# Altium schematic symbol library FPGA_Xilinx_Virtex7.SchLib: 34 symbols (part 26 of 34)
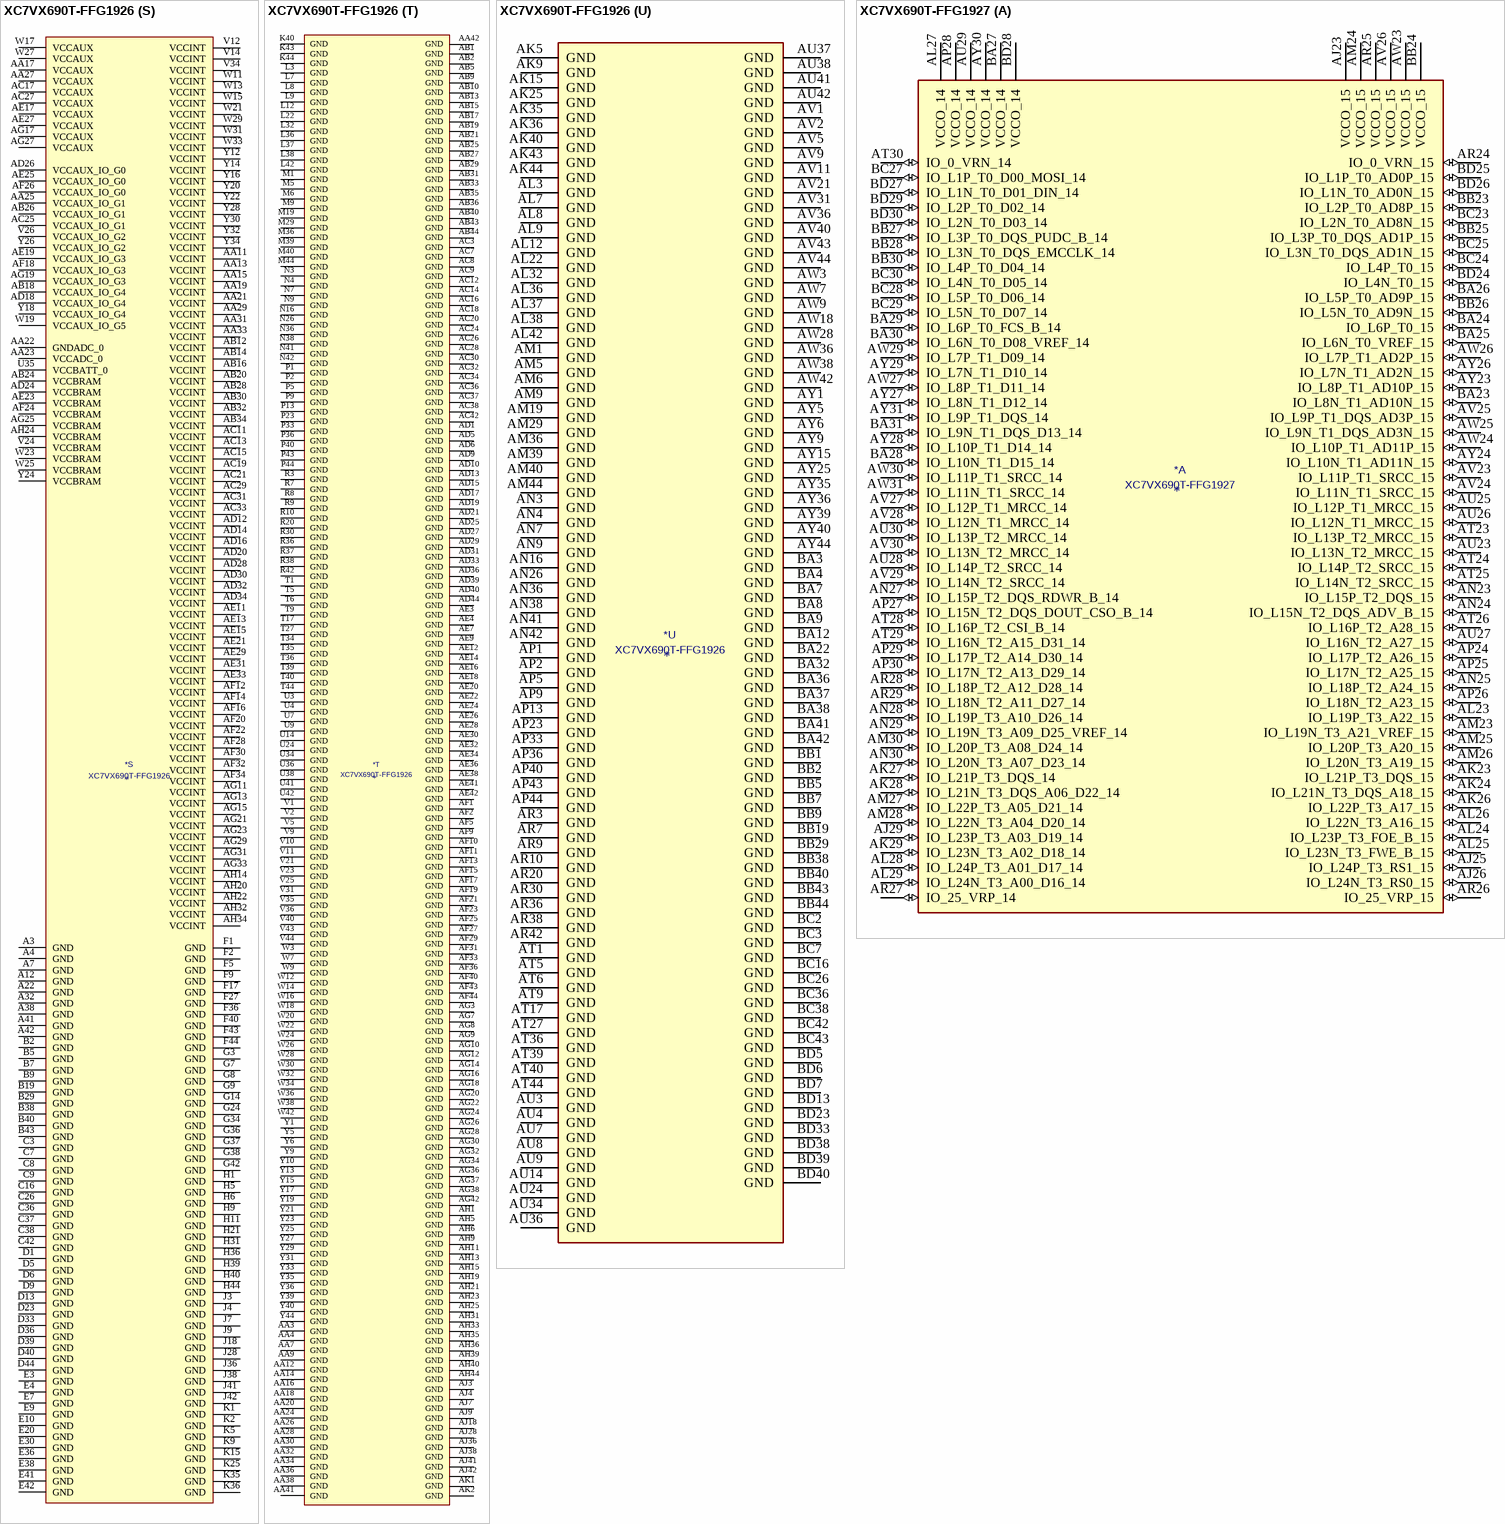
[diagram p197: symbols XC7VX690T-FFG1926 to XC7VX690T-FFG1927]

## XC7VX690T-FFG1926
designator *  value XC7VX690T-FFG1926
ki_keywords: FPGA; ki_description: Virtex 7 XT 690 XC7VX690T-FFG1926
part A pins: AH26 VCCO_11 (power), AH27 IO_L1P_T0_11 (io), AH28 IO_L1N_T0_11 (io), AH29 IO_L3P_T0_DQS_11 (io), AH30 IO_0_VRN_10 (io), AJ26 IO_L2P_T0_11 (io), AJ27 IO_L2N_T0_11 (io), AJ29 IO_L3N_T0_DQS_11 (io), AJ30 IO_L2P_T0_10 (io), AJ31 IO_L2N_T0_10 (io), AK26 IO_L6P_T0_11 (io), AK27 IO_L4P_T0_11 (io), AK28 IO_L4N_T0_11 (io), AK29 IO_L5P_T0_11 (io), AK30 VCCO_10 (power), AK31 IO_L1P_T0_10 (io), AL25 IO_0_VRN_11 (io), AL26 IO_L6N_T0_VREF_11 (io), AL27 VCCO_11 (power), AL28 IO_25_VRP_11 (io), AL29 IO_L5N_T0_11 (io), AL30 IO_L4P_T0_10 (io), AL31 IO_L1N_T0_10 (io), AM25 IO_L8P_T1_11 (io), AM26 IO_L8N_T1_11 (io), AM27 IO_L7P_T1_11 (io), AM28 IO_L7N_T1_11 (io), AM30 IO_L3P_T0_DQS_10 (io), AM31 IO_L4N_T0_10 (io), AM32 IO_L5P_T0_10 (io), AN25 IO_L10P_T1_11 (io), AN27 IO_L9P_T1_DQS_11 (io), AN28 IO_L9N_T1_DQS_11 (io), AN29 IO_L6P_T0_10 (io), AN30 IO_L3N_T0_DQS_10 (io), AN31 VCCO_10 (power), AN32 IO_L5N_T0_10 (io), AP25 IO_L10N_T1_11 (io), AP26 IO_L12P_T1_MRCC_11 (io), AP27 IO_L12N_T1_MRCC_11 (io), AP28 VCCO_11 (power), AP29 IO_25_VRP_10 (io), AP30 IO_L6N_T0_VREF_10 (io), AP31 IO_L15P_T2_DQS_10 (io), AR25 VCCO_11 (power), AR26 IO_L13P_T2_MRCC_11 (io), AR27 IO_L11P_T1_SRCC_11 (io), AR28 IO_L11N_T1_SRCC_11 (io), AR29 IO_L16P_T2_10 (io), AR31 IO_L15N_T2_DQS_10 (io), AT25 IO_L14P_T2_SRCC_11 (io), AT26 IO_L13N_T2_MRCC_11 (io), AT28 IO_L18P_T2_10 (io), AT29 IO_L18N_T2_10 (io), AT30 IO_L16N_T2_10 (io), AT31 IO_L17P_T2_10 (io), AU25 IO_L15P_T2_DQS_11 (io), AU26 IO_L14N_T2_SRCC_11 (io), AU27 IO_L18P_T2_11 (io), AU28 IO_L14P_T2_SRCC_10 (io), AU29 VCCO_10 (power), AU30 IO_L13P_T2_MRCC_10 (io), AU31 IO_L17N_T2_10 (io), AV25 IO_L15N_T2_DQS_11 (io), AV26 VCCO_11 (power), AV27 IO_L18N_T2_11 (io), AV28 IO_L14N_T2_SRCC_10 (io), AV29 IO_L11P_T1_SRCC_10 (io), AV30 IO_L13N_T2_MRCC_10 (io), AW25 IO_L17P_T2_11 (io), AW26 IO_L17N_T2_11 (io), AW27 IO_L16P_T2_11 (io), AW29 IO_L11N_T1_SRCC_10 (io), AW30 IO_L12P_T1_MRCC_10 (io), AW31 IO_L12N_T1_MRCC_10 (io), AY26 IO_L19P_T3_11 (io), AY27 IO_L16N_T2_11 (io), AY28 IO_L7P_T1_10 (io), AY29 IO_L9P_T1_DQS_10 (io), AY30 VCCO_10 (power), AY31 IO_L10P_T1_10 (io), AY32 IO_L10N_T1_10 (io), BA25 IO_L22P_T3_11 (io), BA26 IO_L19N_T3_VREF_11 (io), BA27 VCCO_11 (power), BA28 IO_L7N_T1_10 (io), BA29 IO_L9N_T1_DQS_10 (io), BA30 IO_L8P_T1_10 (io), BA31 IO_L8N_T1_10 (io), BB24 VCCO_11 (power), BB25 IO_L22N_T3_11 (io), BB26 IO_L23P_T3_11 (io), BB27 IO_L23N_T3_11 (io), BB28 IO_L20P_T3_10 (io), BB30 IO_L19P_T3_10 (io), BB31 IO_L19N_T3_VREF_10 (io), BB32 IO_L23P_T3_10 (io), BC25 IO_L21P_T3_DQS_11 (io), BC27 IO_L24P_T3_11 (io), BC28 IO_L20N_T3_10 (io), BC29 IO_L22P_T3_10 (io), BC30 IO_L24P_T3_10 (io), BC31 VCCO_10 (power), BC32 IO_L23N_T3_10 (io), BD24 IO_L20P_T3_11 (io), BD25 IO_L20N_T3_11 (io), BD26 IO_L21N_T3_DQS_11 (io), BD27 IO_L24N_T3_11 (io), BD28 VCCO_10 (power), BD29 IO_L22N_T3_10 (io), BD30 IO_L24N_T3_10 (io), BD31 IO_L21P_T3_DQS_10 (io), BD32 IO_L21N_T3_DQS_10 (io)
part B pins: A23 IO_L24P_T3_13 (io), A24 IO_L24N_T3_13 (io), A25 IO_L22P_T3_13 (io), A26 IO_L22N_T3_13 (io), AJ21 IO_0_VRN_12 (io), AJ22 IO_L4P_T0_12 (io), AJ23 VCCO_12 (power), AJ24 IO_L1N_T0_12 (io), AJ25 IO_L1P_T0_12 (io), AK21 IO_L2P_T0_12 (io), AK22 IO_L4N_T0_12 (io), AK23 IO_L3N_T0_DQS_12 (io), AK24 IO_L3P_T0_DQS_12 (io), AL21 IO_L2N_T0_12 (io), AL23 IO_L5P_T0_12 (io), AL24 IO_25_VRP_12 (io), AM21 IO_L6N_T0_VREF_12 (io), AM22 IO_L6P_T0_12 (io), AM23 IO_L5N_T0_12 (io), AM24 VCCO_12 (power), AN21 VCCO_12 (power), AN22 IO_L10N_T1_12 (io), AN23 IO_L10P_T1_12 (io), AN24 IO_L7P_T1_12 (io), AP21 IO_L8N_T1_12 (io), AP22 IO_L8P_T1_12 (io), AP24 IO_L7N_T1_12 (io), AR21 IO_L12N_T1_MRCC_12 (io), AR22 IO_L12P_T1_MRCC_12 (io), AR23 IO_L9N_T1_DQS_12 (io), AR24 IO_L9P_T1_DQS_12 (io), AT21 IO_L13P_T2_MRCC_12 (io), AT22 VCCO_12 (power), AT23 IO_L11N_T1_SRCC_12 (io), AT24 IO_L11P_T1_SRCC_12 (io), AU21 IO_L13N_T2_MRCC_12 (io), AU22 IO_L14N_T2_SRCC_12 (io), AU23 IO_L14P_T2_SRCC_12 (io), AV22 IO_L16N_T2_12 (io), AV23 IO_L16P_T2_12 (io), AV24 IO_L18P_T2_12 (io), AW21 IO_L15N_T2_DQS_12 (io), AW22 IO_L15P_T2_DQS_12 (io), AW23 VCCO_12 (power), AW24 IO_L18N_T2_12 (io), AY21 IO_L17N_T2_12 (io), AY22 IO_L17P_T2_12 (io), AY23 IO_L19N_T3_VREF_12 (io), AY24 IO_L19P_T3_12 (io), B24 VCCO_13 (power), B25 IO_L20P_T3_13 (io), B26 IO_L20N_T3_13 (io), BA21 IO_L20P_T3_12 (io), BA23 IO_L21N_T3_DQS_12 (io), BA24 IO_L21P_T3_DQS_12 (io), BB21 IO_L20N_T3_12 (io), BB22 IO_L23N_T3_12 (io), BB23 IO_L23P_T3_12 (io), BC21 VCCO_12 (power), BC22 IO_L22P_T3_12 (io), BC23 IO_L24N_T3_12 (io), BC24 IO_L24P_T3_12 (io), BD22 IO_L22N_T3_12 (io), C24 IO_L23P_T3_13 (io), C25 IO_L23N_T3_13 (io), D24 IO_L21P_T3_DQS_13 (io), D25 IO_L21N_T3_DQS_13 (io), D26 IO_L19N_T3_VREF_13 (io), E24 IO_L18N_T2_13 (io), E25 VCCO_13 (power), E26 IO_L19P_T3_13 (io), F24 IO_L18P_T2_13 (io), F25 IO_L16P_T2_13 (io), F26 IO_L16N_T2_13 (io), G25 IO_L17P_T2_13 (io), G26 IO_L17N_T2_13 (io), H24 IO_L15P_T2_DQS_13 (io), H25 IO_L15N_T2_DQS_13 (io), H26 VCCO_13 (power), H27 IO_L13N_T2_MRCC_13 (io), J24 IO_L14P_T2_SRCC_13 (io), J25 IO_L14N_T2_SRCC_13 (io), J26 IO_L11N_T1_SRCC_13 (io), J27 IO_L13P_T2_MRCC_13 (io), K24 IO_L9N_T1_DQS_13 (io), K26 IO_L11P_T1_SRCC_13 (io), K27 IO_L12N_T1_MRCC_13 (io), L24 IO_L9P_T1_DQS_13 (io), L25 IO_L7N_T1_13 (io), L26 IO_L12P_T1_MRCC_13 (io), L27 VCCO_13 (power), M24 VCCO_13 (power), M25 IO_L7P_T1_13 (io), M26 IO_L10P_T1_13 (io), M27 IO_L10N_T1_13 (io), N24 IO_L8P_T1_13 (io), N25 IO_L8N_T1_13 (io), N27 IO_0_VRN_13 (io), P24 IO_L5P_T0_13 (io), P25 IO_L5N_T0_13 (io), P26 IO_L3P_T0_DQS_13 (io), P27 IO_L3N_T0_DQS_13 (io), R24 IO_L6N_T0_VREF_13 (io), R25 VCCO_13 (power), R26 IO_L1P_T0_13 (io), R27 IO_L1N_T0_13 (io), T24 IO_L6P_T0_13 (io), T25 IO_L4P_T0_13 (io), T26 IO_L4N_T0_13 (io), U25 IO_25_VRP_13 (io), U26 IO_L2P_T0_13 (io), U27 IO_L2N_T0_13 (io)
part C pins: A31 IO_L1N_T0_AD0N_15 (io), AJ32 IO_L4P_T0_D04_14 (io), AJ33 VCCO_14 (power), AJ34 IO_L2P_T0_D02_14 (io), AJ35 IO_0_VRN_14 (io), AK32 IO_L4N_T0_D05_14 (io), AK33 IO_L6P_T0_FCS_B_14 (io), AK34 IO_L2N_T0_D03_14 (io), AL33 IO_L3P_T0_DQS_PUDC_B_14 (io), AL34 IO_L6N_T0_D08_VREF_14 (io), AL35 IO_L5P_T0_D06_14 (io), AM33 IO_L3N_T0_DQS_EMCCLK_14 (io), AM34 VCCO_14 (power), AM35 IO_L5N_T0_D07_14 (io), AN33 IO_25_VRP_14 (io), AN34 IO_L1P_T0_D00_MOSI_14 (io), AN35 IO_L1N_T0_D01_DIN_14 (io), AP32 IO_L7P_T1_D09_14 (io), AP34 IO_L8P_T1_D11_14 (io), AP35 IO_L8N_T1_D12_14 (io), AR32 IO_L7N_T1_D10_14 (io), AR33 IO_L10P_T1_D14_14 (io), AR34 IO_L10N_T1_D15_14 (io), AR35 VCCO_14 (power), AT32 VCCO_14 (power), AT33 IO_L9P_T1_DQS_14 (io), AT34 IO_L9N_T1_DQS_D13_14 (io), AT35 IO_L12P_T1_MRCC_14 (io), AU32 IO_L11P_T1_SRCC_14 (io), AU33 IO_L11N_T1_SRCC_14 (io), AU35 IO_L12N_T1_MRCC_14 (io), AV32 IO_L14P_T2_SRCC_14 (io), AV33 IO_L13P_T2_MRCC_14 (io), AV34 IO_L13N_T2_MRCC_14 (io), AV35 IO_L15P_T2_DQS_RDWR_B_14 (io), AW32 IO_L14N_T2_SRCC_14 (io), AW33 VCCO_14 (power), AW34 IO_L17P_T2_A14_D30_14 (io), AW35 IO_L15N_T2_DQS_DOUT_CSO_B_14 (io), AY33 IO_L16P_T2_CSI_B_14 (io), AY34 IO_L17N_T2_A13_D29_14 (io), B31 IO_L1P_T0_AD0P_15 (io), B32 IO_L3N_T0_DQS_AD1N_15 (io), BA33 IO_L16N_T2_A15_D31_14 (io), BA34 IO_L18P_T2_A12_D28_14 (io), BA35 IO_L18N_T2_A11_D27_14 (io), BB33 IO_L20P_T3_A08_D24_14 (io), BB34 VCCO_14 (power), BB35 IO_L19P_T3_A10_D26_14 (io), BB36 IO_L19N_T3_A09_D25_VREF_14 (io), BB37 IO_L21P_T3_DQS_14 (io), BC33 IO_L20N_T3_A07_D23_14 (io), BC34 IO_L22P_T3_A05_D21_14 (io), BC35 IO_L22N_T3_A04_D20_14 (io), BC37 IO_L21N_T3_DQS_A06_D22_14 (io), BD34 IO_L24P_T3_A01_D17_14 (io), BD35 IO_L24N_T3_A00_D16_14 (io), BD36 IO_L23P_T3_A03_D19_14 (io), BD37 IO_L23N_T3_A02_D18_14 (io), C31 VCCO_15 (power), C32 IO_L3P_T0_DQS_AD1P_15 (io), D31 IO_L5N_T0_AD9N_15 (io), D32 IO_L4N_T0_15 (io), E31 IO_L5P_T0_AD9P_15 (io), E32 IO_L4P_T0_15 (io), F31 IO_L2N_T0_AD8N_15 (io), F32 VCCO_15 (power), G31 IO_L2P_T0_AD8P_15 (io), G32 IO_L6P_T0_15 (io), G33 IO_L6N_T0_VREF_15 (io), H32 IO_L9N_T1_DQS_AD3N_15 (io), H33 IO_L8P_T1_AD10P_15 (io), H34 IO_L8N_T1_AD10N_15 (io), J31 IO_L7N_T1_AD2N_15 (io), J32 IO_L9P_T1_DQS_AD3P_15 (io), J33 VCCO_15 (power), J34 IO_L10P_T1_AD11P_15 (io), J35 IO_L10N_T1_AD11N_15 (io), K31 IO_L7P_T1_AD2P_15 (io), K32 IO_L11N_T1_SRCC_15 (io), K33 IO_L12P_T1_MRCC_15 (io), K34 IO_L12N_T1_MRCC_15 (io), L31 IO_L11P_T1_SRCC_15 (io), L33 IO_L13P_T2_MRCC_15 (io), L34 IO_L13N_T2_MRCC_15 (io), L35 IO_L16N_T2_A27_15 (io), M31 IO_L14P_T2_SRCC_15 (io), M32 IO_L14N_T2_SRCC_15 (io), M33 IO_L18N_T2_A23_15 (io), M34 VCCO_15 (power), M35 IO_L16P_T2_A28_15 (io), N31 VCCO_15 (power), N32 IO_L17N_T2_A25_15 (io), N33 IO_L18P_T2_A24_15 (io), N34 IO_L15P_T2_DQS_15 (io), N35 IO_L15N_T2_DQS_ADV_B_15 (io), P31 IO_L20N_T3_A19_15 (io), P32 IO_L17P_T2_A26_15 (io), P34 IO_L24N_T3_RS0_15 (io), P35 IO_0_VRN_15 (io), R31 IO_L20P_T3_A20_15 (io), R32 IO_L22P_T3_A17_15 (io), R33 IO_L22N_T3_A16_15 (io), R34 IO_L24P_T3_RS1_15 (io), R35 VCCO_15 (power), T31 IO_L19N_T3_A21_VREF_15 (io), T32 VCCO_15 (power), T33 IO_L21N_T3_DQS_A18_15 (io), U31 IO_L19P_T3_A22_15 (io), U32 IO_L21P_T3_DQS_15 (io), U33 IO_L23N_T3_FWE_B_15 (io), V32 IO_25_VRP_15 (io), V33 IO_L23P_T3_FOE_B_15 (io)
part D pins: A27 VCCO_16 (power), A28 IO_L24P_T3_16 (io), A29 IO_L24N_T3_16 (io), A30 IO_L23N_T3_16 (io), A33 IO_L16P_T2_17 (io), A34 IO_L16N_T2_17 (io), A35 IO_L15P_T2_DQS_17 (io), A36 IO_L15N_T2_DQS_17 (io), A37 VCCO_17 (power), B27 IO_L22P_T3_16 (io), B28 IO_L22N_T3_16 (io), B30 IO_L23P_T3_16 (io), B33 IO_L6N_T0_VREF_17 (io), B34 VCCO_17 (power), B35 IO_L18P_T2_17 (io), B36 IO_L17P_T2_17 (io), B37 IO_L17N_T2_17 (io), C27 IO_L20P_T3_16 (io), C28 IO_L20N_T3_16 (io), C29 IO_L21P_T3_DQS_16 (io), C30 IO_L21N_T3_DQS_16 (io), C33 IO_L12P_T1_MRCC_17 (io), C34 IO_L12N_T1_MRCC_17 (io), C35 IO_L11N_T1_SRCC_17 (io), D27 IO_L18N_T2_16 (io), D28 VCCO_16 (power), D29 IO_L19P_T3_16 (io), D30 IO_L19N_T3_VREF_16 (io), D34 IO_L13N_T2_MRCC_17 (io), D35 IO_L11P_T1_SRCC_17 (io), E27 IO_L18P_T2_16 (io), E28 IO_L16P_T2_16 (io), E29 IO_L16N_T2_16 (io), E33 IO_L13P_T2_MRCC_17 (io), E34 IO_L14N_T2_SRCC_17 (io), E35 VCCO_17 (power), F28 IO_L17P_T2_16 (io), F29 IO_L17N_T2_16 (io), F30 IO_L15N_T2_DQS_16 (io), F33 IO_0_VRN_17 (io), F34 IO_L14P_T2_SRCC_17 (io), F35 IO_L19N_T3_VREF_17 (io), G27 IO_L14P_T2_SRCC_16 (io), G28 IO_L14N_T2_SRCC_16 (io), G29 VCCO_16 (power), G30 IO_L15P_T2_DQS_16 (io), G35 IO_L19P_T3_17 (io), H28 IO_L13P_T2_MRCC_16 (io), H29 IO_L13N_T2_MRCC_16 (io), H30 IO_L11N_T1_SRCC_16 (io), H35 IO_25_VRP_17 (io), J29 IO_L12N_T1_MRCC_16 (io), J30 IO_L11P_T1_SRCC_16 (io), K28 IO_L10N_T1_16 (io), K29 IO_L12P_T1_MRCC_16 (io), K30 VCCO_16 (power), L28 IO_L10P_T1_16 (io), L29 IO_L9P_T1_DQS_16 (io), L30 IO_L9N_T1_DQS_16 (io), M28 IO_L8N_T1_16 (io), M30 IO_L7N_T1_16 (io), N28 IO_L8P_T1_16 (io), N29 IO_L6N_T0_VREF_16 (io), N30 IO_L7P_T1_16 (io), P28 VCCO_16 (power), P29 IO_L6P_T0_16 (io), P30 IO_25_VRP_16 (io), R28 IO_L4P_T0_16 (io), R29 IO_L4N_T0_16 (io), T28 IO_L2P_T0_16 (io), T29 IO_L2N_T0_16 (io), T30 IO_L5N_T0_16 (io), U28 IO_L3N_T0_DQS_16 (io), U29 VCCO_16 (power), U30 IO_L5P_T0_16 (io), V27 IO_0_VRN_16 (io), V28 IO_L3P_T0_DQS_16 (io), V29 IO_L1P_T0_16 (io), V30 IO_L1N_T0_16 (io)
part E pins: AH16 VCCO_30 (power), AH17 IO_L2N_T0_31 (io), AH18 IO_L2P_T0_31 (io), AJ14 IO_0_VRN_30 (io), AJ15 IO_L2N_T0_30 (io), AJ16 IO_L2P_T0_30 (io), AJ17 IO_0_VRN_31 (io), AJ19 IO_L4N_T0_31 (io), AJ20 IO_L4P_T0_31 (io), AK14 IO_L4P_T0_30 (io), AK16 IO_L1P_T0_30 (io), AK17 IO_L1N_T0_31 (io), AK18 IO_L1P_T0_31 (io), AK19 IO_L6P_T0_31 (io), AK20 VCCO_31 (power), AL14 IO_L4N_T0_30 (io), AL15 IO_L3P_T0_DQS_30 (io), AL16 IO_L1N_T0_30 (io), AL17 VCCO_31 (power), AL18 IO_L3P_T0_DQS_31 (io), AL19 IO_L6N_T0_VREF_31 (io), AL20 IO_L5P_T0_31 (io), AM14 VCCO_30 (power), AM15 IO_L3N_T0_DQS_30 (io), AM16 IO_25_VRP_30 (io), AM17 IO_L10P_T1_31 (io), AM18 IO_L3N_T0_DQS_31 (io), AM20 IO_L5N_T0_31 (io), AN14 IO_L5N_T0_30 (io), AN15 IO_L5P_T0_30 (io), AN17 IO_L10N_T1_31 (io), AN18 IO_L7N_T1_31 (io), AN19 IO_L7P_T1_31 (io), AN20 IO_25_VRP_31 (io), AP14 IO_L15P_T2_DQS_30 (io), AP15 IO_L6N_T0_VREF_30 (io), AP16 IO_L6P_T0_30 (io), AP17 IO_L8P_T1_31 (io), AP18 VCCO_31 (power), AP19 IO_L9N_T1_DQS_31 (io), AP20 IO_L9P_T1_DQS_31 (io), AR14 IO_L15N_T2_DQS_30 (io), AR15 VCCO_30 (power), AR16 IO_L16P_T2_30 (io), AR17 IO_L8N_T1_31 (io), AR18 IO_L11N_T1_SRCC_31 (io), AR19 IO_L11P_T1_SRCC_31 (io), AT13 IO_L17N_T2_30 (io), AT14 IO_L17P_T2_30 (io), AT15 IO_L16N_T2_30 (io), AT16 IO_L18P_T2_30 (io), AT18 IO_L12N_T1_MRCC_31 (io), AT19 IO_L12P_T1_MRCC_31 (io), AT20 IO_L13P_T2_MRCC_31 (io), AU13 IO_L13P_T2_MRCC_30 (io), AU15 IO_L14P_T2_SRCC_30 (io), AU16 IO_L18N_T2_30 (io), AU17 IO_L14N_T2_SRCC_31 (io), AU18 IO_L14P_T2_SRCC_31 (io), AU19 VCCO_31 (power), AU20 IO_L13N_T2_MRCC_31 (io), AV13 IO_L13N_T2_MRCC_30 (io), AV14 IO_L12P_T1_MRCC_30 (io), AV15 IO_L14N_T2_SRCC_30 (io), AV16 VCCO_30 (power), AV17 IO_L17P_T2_31 (io), AV18 IO_L15N_T2_DQS_31 (io), AV19 IO_L15P_T2_DQS_31 (io), AV20 IO_L16P_T2_31 (io), AW13 VCCO_30 (power), AW14 IO_L12N_T1_MRCC_30 (io), AW15 IO_L11N_T1_SRCC_30 (io), AW16 IO_L11P_T1_SRCC_30 (io), AW17 IO_L17N_T2_31 (io), AW19 IO_L18P_T2_31 (io), AW20 IO_L16N_T2_31 (io), AY13 IO_L10P_T1_30 (io), AY14 IO_L8P_T1_30 (io), AY16 IO_L7N_T1_30 (io), AY17 IO_L7P_T1_30 (io), AY18 IO_L19P_T3_31 (io), AY19 IO_L18N_T2_31 (io), AY20 VCCO_31 (power), BA13 IO_L10N_T1_30 (io), BA14 IO_L8N_T1_30 (io), BA15 IO_L9N_T1_DQS_30 (io), BA16 IO_L9P_T1_DQS_30 (io), BA17 VCCO_30 (power), BA18 IO_L19N_T3_VREF_31 (io), BA19 IO_L21N_T3_DQS_31 (io), BA20 IO_L21P_T3_DQS_31 (io), BB13 IO_L23P_T3_30 (io), BB14 VCCO_30 (power), BB15 IO_L19N_T3_VREF_30 (io), BB16 IO_L19P_T3_30 (io), BB17 IO_L20P_T3_30 (io), BB18 IO_L23P_T3_31 (io), BB20 IO_L20P_T3_31 (io), BC13 IO_L23N_T3_30 (io), BC14 IO_L24N_T3_30 (io), BC15 IO_L24P_T3_30 (io), BC17 IO_L20N_T3_30 (io), BC18 IO_L23N_T3_31 (io), BC19 IO_L24P_T3_31 (io), BC20 IO_L20N_T3_31 (io), BD14 IO_L21N_T3_DQS_30 (io), BD15 IO_L21P_T3_DQS_30 (io), BD16 IO_L22N_T3_30 (io), BD17 IO_L22P_T3_30 (io), BD18 VCCO_31 (power), BD19 IO_L24N_T3_31 (io), BD20 IO_L22N_T3_31 (io), BD21 IO_L22P_T3_31 (io)
part F pins: A20 IO_L24N_T3_33 (io), A21 IO_L24P_T3_33 (io), AH10 IO_0_VRN_32 (io), AH12 IO_L2P_T0_32 (io), AJ10 IO_L4N_T0_32 (io), AJ11 IO_L4P_T0_32 (io), AJ12 IO_L2N_T0_32 (io), AJ13 VCCO_32 (power), AK10 VCCO_32 (power), AK11 IO_L1P_T0_32 (io), AK12 IO_L6N_T0_VREF_32 (io), AK13 IO_L6P_T0_32 (io), AL10 IO_L3P_T0_DQS_32 (io), AL11 IO_L1N_T0_32 (io), AL13 IO_25_VRP_32 (io), AM10 IO_L3N_T0_DQS_32 (io), AM11 IO_L5N_T0_32 (io), AM12 IO_L5P_T0_32 (io), AM13 IO_L8P_T1_32 (io), AN10 IO_L7P_T1_32 (io), AN11 VCCO_32 (power), AN12 IO_L10P_T1_32 (io), AN13 IO_L8N_T1_32 (io), AP10 IO_L7N_T1_32 (io), AP11 IO_L9P_T1_DQS_32 (io), AP12 IO_L10N_T1_32 (io), AR11 IO_L9N_T1_DQS_32 (io), AR12 IO_L12N_T1_MRCC_32 (io), AR13 IO_L12P_T1_MRCC_32 (io), AT10 IO_L11N_T1_SRCC_32 (io), AT11 IO_L11P_T1_SRCC_32 (io), AT12 VCCO_32 (power), AU10 IO_L13N_T2_MRCC_32 (io), AU11 IO_L13P_T2_MRCC_32 (io), AU12 IO_L14P_T2_SRCC_32 (io), AV10 IO_L15P_T2_DQS_32 (io), AV12 IO_L14N_T2_SRCC_32 (io), AW10 IO_L15N_T2_DQS_32 (io), AW11 IO_L16P_T2_32 (io), AW12 IO_L18P_T2_32 (io), AY10 VCCO_32 (power), AY11 IO_L16N_T2_32 (io), AY12 IO_L18N_T2_32 (io), B20 IO_L23N_T3_33 (io), B21 IO_L23P_T3_33 (io), B22 IO_L20N_T3_33 (io), B23 IO_L22N_T3_33 (io), BA10 IO_L17N_T2_32 (io), BA11 IO_L17P_T2_32 (io), BB8 IO_L21P_T3_DQS_32 (io), BB10 IO_L19N_T3_VREF_32 (io), BB11 IO_L19P_T3_32 (io), BB12 IO_L22P_T3_32 (io), BC8 IO_L21N_T3_DQS_32 (io), BC9 IO_L23N_T3_32 (io), BC10 IO_L23P_T3_32 (io), BC11 VCCO_32 (power), BC12 IO_L22N_T3_32 (io), BD8 VCCO_32 (power), BD9 IO_L20N_T3_32 (io), BD10 IO_L20P_T3_32 (io), BD11 IO_L24N_T3_32 (io), BD12 IO_L24P_T3_32 (io), C21 VCCO_33 (power), C22 IO_L20P_T3_33 (io), C23 IO_L22P_T3_33 (io), D21 IO_L21N_T3_DQS_33 (io), D22 IO_L21P_T3_DQS_33 (io), E21 IO_L19N_T3_VREF_33 (io), E22 IO_L19P_T3_33 (io), E23 IO_L18N_T2_33 (io), F21 IO_L15N_T2_DQS_33 (io), F22 VCCO_33 (power), F23 IO_L18P_T2_33 (io), G21 IO_L15P_T2_DQS_33 (io), G22 IO_L17N_T2_33 (io), G23 IO_L16N_T2_33 (io), H22 IO_L17P_T2_33 (io), H23 IO_L16P_T2_33 (io), J21 IO_L13N_T2_MRCC_33 (io), J22 IO_L13P_T2_MRCC_33 (io), J23 VCCO_33 (power), K20 VCCO_33 (power), K21 IO_L12N_T1_MRCC_33 (io), K22 IO_L14N_T2_SRCC_33 (io), K23 IO_L14P_T2_SRCC_33 (io), L20 IO_L10N_T1_33 (io), L21 IO_L12P_T1_MRCC_33 (io), L23 IO_L11N_T1_SRCC_33 (io), M20 IO_L10P_T1_33 (io), M21 IO_L7N_T1_33 (io), M22 IO_L7P_T1_33 (io), M23 IO_L11P_T1_SRCC_33 (io), N20 IO_L8N_T1_33 (io), N21 VCCO_33 (power), N22 IO_L9N_T1_DQS_33 (io), N23 IO_L9P_T1_DQS_33 (io), P20 IO_L8P_T1_33 (io), P21 IO_L6N_T0_VREF_33 (io), P22 IO_L1N_T0_33 (io), R21 IO_L6P_T0_33 (io), R22 IO_L1P_T0_33 (io), R23 IO_25_VRP_33 (io), T20 IO_L2N_T0_33 (io), T21 IO_L4N_T0_33 (io), T22 VCCO_33 (power), T23 IO_L3N_T0_DQS_33 (io), U20 IO_L2P_T0_33 (io), U21 IO_L4P_T0_33 (io), U22 IO_L5N_T0_33 (io), U23 IO_L3P_T0_DQS_33 (io), V20 IO_0_VRN_33 (io), V22 IO_L5P_T0_33 (io)
part G pins: A13 IO_L2N_T0_34 (io), A14 IO_L5N_T0_34 (io), A15 IO_L5P_T0_34 (io), A16 IO_L1N_T0_34 (io), A17 VCCO_35 (power), A18 IO_L24N_T3_35 (io), A19 IO_L24P_T3_35 (io), B12 IO_L4N_T0_34 (io), B13 IO_L2P_T0_34 (io), B14 VCCO_34 (power), B15 IO_L3N_T0_DQS_34 (io), B16 IO_L1P_T0_34 (io), B17 IO_L23N_T3_35 (io), B18 IO_L23P_T3_35 (io), C12 IO_L4P_T0_34 (io), C13 IO_L6N_T0_VREF_34 (io), C14 IO_L6P_T0_34 (io), C15 IO_L3P_T0_DQS_34 (io), C17 IO_L21N_T3_DQS_35 (io), C18 IO_L21P_T3_DQS_35 (io), C19 IO_L22N_T3_35 (io), C20 IO_L22P_T3_35 (io), D14 IO_L10N_T1_34 (io), D15 IO_L10P_T1_34 (io), D16 IO_L19N_T3_VREF_35 (io), D17 IO_L19P_T3_35 (io), D18 VCCO_35 (power), D19 IO_L20N_T3_35 (io), D20 IO_L20P_T3_35 (io), E13 IO_L7N_T1_34 (io), E14 IO_L7P_T1_34 (io), E15 VCCO_34 (power), E16 IO_L8N_T1_34 (io), E17 IO_L18N_T2_35 (io), E18 IO_L18P_T2_35 (io), E19 IO_L17N_T2_35 (io), F13 IO_L11N_T1_SRCC_34 (io), F14 IO_L9N_T1_DQS_34 (io), F15 IO_L9P_T1_DQS_34 (io), F16 IO_L8P_T1_34 (io), F18 IO_L15N_T2_DQS_35 (io), F19 IO_L17P_T2_35 (io), F20 IO_L16N_T2_35 (io), G13 IO_L11P_T1_SRCC_34 (io), G15 IO_L12N_T1_MRCC_34 (io), G16 IO_L12P_T1_MRCC_34 (io), G17 IO_L14N_T2_SRCC_35 (io), G18 IO_L15P_T2_DQS_35 (io), G19 VCCO_35 (power), G20 IO_L16P_T2_35 (io), H13 IO_L14N_T2_SRCC_34 (io), H14 IO_L14P_T2_SRCC_34 (io), H15 IO_L13N_T2_MRCC_34 (io), H16 VCCO_34 (power), H17 IO_L14P_T2_SRCC_35 (io), H18 IO_L13N_T2_MRCC_35 (io), H19 IO_L13P_T2_MRCC_35 (io), H20 IO_L11N_T1_SRCC_35 (io), J14 IO_L15N_T2_DQS_34 (io), J15 IO_L13P_T2_MRCC_34 (io), J16 IO_L16N_T2_34 (io), J17 IO_L9N_T1_DQS_AD7N_35 (io), J19 IO_L12N_T1_MRCC_35 (io), J20 IO_L11P_T1_SRCC_35 (io), K14 IO_L15P_T2_DQS_34 (io), K16 IO_L16P_T2_34 (io), K17 IO_L9P_T1_DQS_AD7P_35 (io), K18 IO_L7N_T1_AD6N_35 (io), K19 IO_L12P_T1_MRCC_35 (io), L14 IO_L17N_T2_34 (io), L15 IO_L17P_T2_34 (io), L16 IO_L18N_T2_34 (io), L17 VCCO_35 (power), L18 IO_L10N_T1_AD15N_35 (io), L19 IO_L7P_T1_AD6P_35 (io), M14 VCCO_34 (power), M15 IO_L24N_T3_34 (io), M16 IO_L18P_T2_34 (io), M17 IO_L8N_T1_AD14N_35 (io), M18 IO_L10P_T1_AD15P_35 (io), N14 IO_L21N_T3_DQS_34 (io), N15 IO_L24P_T3_34 (io), N17 IO_L8P_T1_AD14P_35 (io), N18 IO_L3N_T0_DQS_AD5N_35 (io), N19 IO_L3P_T0_DQS_AD5P_35 (io), P14 IO_L21P_T3_DQS_34 (io), P15 IO_L22N_T3_34 (io), P16 IO_L22P_T3_34 (io), P17 IO_L1N_T0_AD4N_35 (io), P18 VCCO_35 (power), P19 IO_25_VRP_35 (io), R14 IO_L23N_T3_34 (io), R15 VCCO_34 (power), R16 IO_0_VRN_34 (io), R17 IO_L1P_T0_AD4P_35 (io), R18 IO_L6N_T0_VREF_35 (io), R19 IO_L5N_T0_AD13N_35 (io), T14 IO_L23P_T3_34 (io), T15 IO_L19N_T3_VREF_34 (io), T16 IO_L20N_T3_34 (io), T18 IO_L6P_T0_35 (io), T19 IO_L5P_T0_AD13P_35 (io), U15 IO_L19P_T3_34 (io), U16 IO_L20P_T3_34 (io), U17 IO_L4N_T0_35 (io), U18 IO_L4P_T0_35 (io), U19 VCCO_35 (power), V15 IO_25_VRP_34 (io), V16 VCCO_34 (power), V17 IO_0_VRN_35 (io), V18 IO_L2N_T0_AD12N_35 (io), V19 IO_L2P_T0_AD12P_35 (io)
part H pins: A8 IO_L5N_T0_36 (io), A9 IO_L3N_T0_DQS_36 (io), A10 IO_L3P_T0_DQS_36 (io), A11 IO_L1N_T0_36 (io), B8 IO_L5P_T0_36 (io), B10 IO_L4N_T0_36 (io), B11 IO_L1P_T0_36 (io), C10 IO_L4P_T0_36 (io), C11 VCCO_36 (power), D10 IO_L2N_T0_36 (io), D11 IO_L2P_T0_36 (io), D12 IO_L6N_T0_VREF_36 (io), E11 IO_L8N_T1_36 (io), E12 IO_L6P_T0_36 (io), F10 IO_L10N_T1_36 (io), F11 IO_L8P_T1_36 (io), F12 VCCO_36 (power), G10 IO_L10P_T1_36 (io), G11 IO_L7N_T1_36 (io), G12 IO_L7P_T1_36 (io), H10 IO_L9N_T1_DQS_36 (io), H12 IO_L11N_T1_SRCC_36 (io), J10 IO_L9P_T1_DQS_36 (io), J11 IO_L12N_T1_MRCC_36 (io), J12 IO_L11P_T1_SRCC_36 (io), J13 VCCO_36 (power), K10 VCCO_36 (power), K11 IO_L12P_T1_MRCC_36 (io), K12 IO_L13N_T2_MRCC_36 (io), K13 IO_L13P_T2_MRCC_36 (io), L10 IO_L14N_T2_SRCC_36 (io), L11 IO_L14P_T2_SRCC_36 (io), L13 IO_L15N_T2_DQS_36 (io), M10 IO_L18N_T2_36 (io), M11 IO_L16N_T2_36 (io), M12 IO_L16P_T2_36 (io), M13 IO_L15P_T2_DQS_36 (io), N10 IO_L18P_T2_36 (io), N11 VCCO_36 (power), N12 IO_L17N_T2_36 (io), N13 IO_L17P_T2_36 (io), P10 IO_0_VRN_36 (io), P11 IO_L20N_T3_36 (io), P12 IO_L20P_T3_36 (io), R11 IO_L22N_T3_36 (io), R12 IO_L22P_T3_36 (io), R13 IO_L24N_T3_36 (io), T10 IO_L19N_T3_VREF_36 (io), T11 IO_L19P_T3_36 (io), T12 VCCO_36 (power), T13 IO_L24P_T3_36 (io), U10 IO_L23N_T3_36 (io), U11 IO_L23P_T3_36 (io), U12 IO_L21N_T3_DQS_36 (io), U13 IO_L21P_T3_DQS_36 (io), V13 IO_25_VRP_36 (io)
part I pins: AN5 MGTHRXN3_112 (io), AN6 MGTHRXP3_112 (io), AP3 MGTHTXN3_112 (io), AP4 MGTHTXP3_112 (io), AP7 MGTREFCLK0N_112 (io), AP8 MGTREFCLK0P_112 (io), AR1 MGTHTXN2_112 (io), AR2 MGTHTXP2_112 (io), AR5 MGTHRXN2_112 (io), AR6 MGTHRXP2_112 (io), AT3 MGTHRXN1_112 (io), AT4 MGTHRXP1_112 (io), AT7 MGTREFCLK1N_112 (io), AT8 MGTREFCLK1P_112 (io), AU1 MGTHTXN1_112 (io), AU2 MGTHTXP1_112 (io), AU5 MGTHRXN0_112 (io), AU6 MGTHRXP0_112 (io), AV3 MGTHTXN0_112 (io), AV4 MGTHTXP0_112 (io), AV7 MGTREFCLK0N_111 (io), AV8 MGTREFCLK0P_111 (io), AW1 MGTHTXN3_111 (io), AW2 MGTHTXP3_111 (io), AW5 MGTHRXN3_111 (io), AW6 MGTHRXP3_111 (io), AY3 MGTHRXN2_111 (io), AY4 MGTHRXP2_111 (io), AY7 MGTREFCLK1N_111 (io), AY8 MGTREFCLK1P_111 (io), BA1 MGTHTXN2_111 (io), BA2 MGTHTXP2_111 (io), BA5 MGTHRXN1_111 (io), BA6 MGTHRXP1_111 (io), BB3 MGTHTXN1_111 (io), BB4 MGTHTXP1_111 (io), BC5 MGTHRXN0_111 (io), BC6 MGTHRXP0_111 (io), BD3 MGTHTXN0_111 (io), BD4 MGTHTXP0_111 (io)
part J pins: AC1 MGTHTXN3_114 (io), AC2 MGTHTXP3_114 (io), AC5 MGTHRXN3_114 (io), AC6 MGTHRXP3_114 (io), AD3 MGTHRXN2_114 (io), AD4 MGTHRXP2_114 (io), AD7 MGTREFCLK0N_114 (io), AD8 MGTREFCLK0P_114 (io), AE1 MGTHTXN2_114 (io), AE2 MGTHTXP2_114 (io), AE5 MGTHRXN1_114 (io), AE6 MGTHRXP1_114 (io), AF3 MGTHTXN1_114 (io), AF4 MGTHTXP1_114 (io), AF7 MGTREFCLK1N_114 (io), AF8 MGTREFCLK1P_114 (io), AG1 MGTHTXN0_114 (io), AG2 MGTHTXP0_114 (io), AG5 MGTHRXN0_114 (io), AG6 MGTHRXP0_114 (io), AH3 MGTHRXN3_113 (io), AH4 MGTHRXP3_113 (io), AH7 MGTREFCLK0N_113 (io), AH8 MGTREFCLK0P_113 (io), AJ1 MGTHTXN3_113 (io), AJ2 MGTHTXP3_113 (io), AJ5 MGTHRXN2_113 (io), AJ6 MGTHRXP2_113 (io), AK3 MGTHTXN2_113 (io), AK4 MGTHTXP2_113 (io), AK7 MGTREFCLK1N_113 (io), AK8 MGTREFCLK1P_113 (io), AL1 MGTHTXN1_113 (io), AL2 MGTHTXP1_113 (io), AL5 MGTHRXN1_113 (io), AL6 MGTHRXP1_113 (io), AM3 MGTHRXN0_113 (io), AM4 MGTHRXP0_113 (io), AN1 MGTHTXN0_113 (io), AN2 MGTHTXP0_113 (io)
part K pins: AA1 MGTHTXN1_115 (io), AA2 MGTHTXP1_115 (io), AA5 MGTHRXN0_115 (io), AA6 MGTHRXP0_115 (io), AB3 MGTHTXN0_115 (io), AB4 MGTHTXP0_115 (io), AB7 MGTREFCLK1N_115 (io), AB8 MGTREFCLK1P_115 (io), M3 MGTHRXN3_116 (io), M4 MGTHRXP3_116 (io), N1 MGTHTXN3_116 (io), N2 MGTHTXP3_116 (io), N5 MGTHRXN2_116 (io), N6 MGTHRXP2_116 (io), P3 MGTHTXN2_116 (io), P4 MGTHTXP2_116 (io), P7 MGTREFCLK0N_116 (io), P8 MGTREFCLK0P_116 (io), R1 MGTHTXN1_116 (io), R2 MGTHTXP1_116 (io), R5 MGTHRXN1_116 (io), R6 MGTHRXP1_116 (io), T3 MGTHRXN0_116 (io), T4 MGTHRXP0_116 (io), T7 MGTREFCLK1N_116 (io), T8 MGTREFCLK1P_116 (io), U1 MGTHTXN0_116 (io), U2 MGTHTXP0_116 (io), U5 MGTHRXN3_115 (io), U6 MGTHRXP3_115 (io), V3 MGTHTXN3_115 (io), V4 MGTHTXP3_115 (io), V7 MGTREFCLK0N_115 (io), V8 MGTREFCLK0P_115 (io), W1 MGTHTXN2_115 (io), W2 MGTHTXP2_115 (io), W5 MGTHRXN2_115 (io), W6 MGTHRXP2_115 (io), Y3 MGTHRXN1_115 (io), Y4 MGTHRXP1_115 (io)
part L pins: A5 MGTHRXN3_118 (io), A6 MGTHRXP3_118 (io), B3 MGTHTXN3_118 (io), B4 MGTHTXP3_118 (io), C1 MGTHTXN2_118 (io), C2 MGTHTXP2_118 (io), C5 MGTHRXN2_118 (io), C6 MGTHRXP2_118 (io), D3 MGTHRXN1_118 (io), D4 MGTHRXP1_118 (io), D7 MGTREFCLK0N_118 (io), D8 MGTREFCLK0P_118 (io), E1 MGTHTXN1_118 (io), E2 MGTHTXP1_118 (io), E5 MGTHRXN0_118 (io), E6 MGTHRXP0_118 (io), F3 MGTHTXN0_118 (io), F4 MGTHTXP0_118 (io), F7 MGTREFCLK1N_118 (io), F8 MGTREFCLK1P_118 (io), G1 MGTHTXN3_117 (io), G2 MGTHTXP3_117 (io), G5 MGTHRXN3_117 (io), G6 MGTHRXP3_117 (io), H3 MGTHRXN2_117 (io), H4 MGTHRXP2_117 (io), J1 MGTHTXN2_117 (io), J2 MGTHTXP2_117 (io), J5 MGTHRXN1_117 (io), J6 MGTHRXP1_117 (io), K3 MGTHTXN1_117 (io), K4 MGTHTXP1_117 (io), K7 MGTREFCLK0N_117 (io), K8 MGTREFCLK0P_117 (io), L1 MGTHTXN0_117 (io), L2 MGTHTXP0_117 (io), L5 MGTHRXN0_117 (io), L6 MGTHRXP0_117 (io), M7 MGTREFCLK1N_117 (io), M8 MGTREFCLK1P_117 (io)
part M pins: AN39 MGTHRXP3_212 (io), AN40 MGTHRXN3_212 (io), AP37 MGTREFCLK0P_212 (io), AP38 MGTREFCLK0N_212 (io), AP41 MGTHTXP3_212 (io), AP42 MGTHTXN3_212 (io), AR39 MGTHRXP2_212 (io), AR40 MGTHRXN2_212 (io), AR43 MGTHTXP2_212 (io), AR44 MGTHTXN2_212 (io), AT37 MGTREFCLK1P_212 (io), AT38 MGTREFCLK1N_212 (io), AT41 MGTHRXP1_212 (io), AT42 MGTHRXN1_212 (io), AU39 MGTHRXP0_212 (io), AU40 MGTHRXN0_212 (io), AU43 MGTHTXP1_212 (io), AU44 MGTHTXN1_212 (io), AV37 MGTREFCLK0P_211 (io), AV38 MGTREFCLK0N_211 (io), AV41 MGTHTXP0_212 (io), AV42 MGTHTXN0_212 (io), AW39 MGTHRXP3_211 (io), AW40 MGTHRXN3_211 (io), AW43 MGTHTXP3_211 (io), AW44 MGTHTXN3_211 (io), AY37 MGTREFCLK1P_211 (io), AY38 MGTREFCLK1N_211 (io), AY41 MGTHRXP2_211 (io), AY42 MGTHRXN2_211 (io), BA39 MGTHRXP1_211 (io), BA40 MGTHRXN1_211 (io), BA43 MGTHTXP2_211 (io), BA44 MGTHTXN2_211 (io), BB41 MGTHTXP1_211 (io), BB42 MGTHTXN1_211 (io), BC39 MGTHRXP0_211 (io), BC40 MGTHRXN0_211 (io), BD41 MGTHTXP0_211 (io), BD42 MGTHTXN0_211 (io)
part N pins: AC39 MGTHRXP3_214 (io), AC40 MGTHRXN3_214 (io), AC43 MGTHTXP3_214 (io), AC44 MGTHTXN3_214 (io), AD37 MGTREFCLK0P_214 (io), AD38 MGTREFCLK0N_214 (io), AD41 MGTHRXP2_214 (io), AD42 MGTHRXN2_214 (io), AE39 MGTHRXP1_214 (io), AE40 MGTHRXN1_214 (io), AE43 MGTHTXP2_214 (io), AE44 MGTHTXN2_214 (io), AF37 MGTREFCLK1P_214 (io), AF38 MGTREFCLK1N_214 (io), AF41 MGTHTXP1_214 (io), AF42 MGTHTXN1_214 (io), AG39 MGTHRXP0_214 (io), AG40 MGTHRXN0_214 (io), AG43 MGTHTXP0_214 (io), AG44 MGTHTXN0_214 (io), AH37 MGTREFCLK0P_213 (io), AH38 MGTREFCLK0N_213 (io), AH41 MGTHRXP3_213 (io), AH42 MGTHRXN3_213 (io), AJ39 MGTHRXP2_213 (io), AJ40 MGTHRXN2_213 (io), AJ43 MGTHTXP3_213 (io), AJ44 MGTHTXN3_213 (io), AK37 MGTREFCLK1P_213 (io), AK38 MGTREFCLK1N_213 (io), AK41 MGTHTXP2_213 (io), AK42 MGTHTXN2_213 (io), AL39 MGTHRXP1_213 (io), AL40 MGTHRXN1_213 (io), AL43 MGTHTXP1_213 (io), AL44 MGTHTXN1_213 (io), AM41 MGTHRXP0_213 (io), AM42 MGTHRXN0_213 (io), AN43 MGTHTXP0_213 (io), AN44 MGTHTXN0_213 (io)
part O pins: AA39 MGTHRXP0_215 (io), AA40 MGTHRXN0_215 (io), AA43 MGTHTXP1_215 (io), AA44 MGTHTXN1_215 (io), AB37 MGTREFCLK1P_215 (io), AB38 MGTREFCLK1N_215 (io), AB41 MGTHTXP0_215 (io), AB42 MGTHTXN0_215 (io), M41 MGTHRXP3_216 (io), M42 MGTHRXN3_216 (io), N39 MGTHRXP2_216 (io), N40 MGTHRXN2_216 (io), N43 MGTHTXP3_216 (io), N44 MGTHTXN3_216 (io), P37 MGTREFCLK0P_216 (io), P38 MGTREFCLK0N_216 (io), P41 MGTHTXP2_216 (io), P42 MGTHTXN2_216 (io), R39 MGTHRXP1_216 (io), R40 MGTHRXN1_216 (io), R43 MGTHTXP1_216 (io), R44 MGTHTXN1_216 (io), T37 MGTREFCLK1P_216 (io), T38 MGTREFCLK1N_216 (io), T41 MGTHRXP0_216 (io), T42 MGTHRXN0_216 (io), U39 MGTHRXP3_215 (io), U40 MGTHRXN3_215 (io), U43 MGTHTXP0_216 (io), U44 MGTHTXN0_216 (io), V37 MGTREFCLK0P_215 (io), V38 MGTREFCLK0N_215 (io), V41 MGTHTXP3_215 (io), V42 MGTHTXN3_215 (io), W39 MGTHRXP2_215 (io), W40 MGTHRXN2_215 (io), W43 MGTHTXP2_215 (io), W44 MGTHTXN2_215 (io), Y41 MGTHRXP1_215 (io), Y42 MGTHRXN1_215 (io)
part P pins: A39 MGTHRXP3_218 (io), A40 MGTHRXN3_218 (io), B41 MGTHTXP3_218 (io), B42 MGTHTXN3_218 (io), C39 MGTHRXP2_218 (io), C40 MGTHRXN2_218 (io), C43 MGTHTXP2_218 (io), C44 MGTHTXN2_218 (io), D37 MGTREFCLK0P_218 (io), D38 MGTREFCLK0N_218 (io), D41 MGTHRXP1_218 (io), D42 MGTHRXN1_218 (io), E39 MGTHRXP0_218 (io), E40 MGTHRXN0_218 (io), E43 MGTHTXP1_218 (io), E44 MGTHTXN1_218 (io), F37 MGTREFCLK1P_218 (io), F38 MGTREFCLK1N_218 (io), F41 MGTHTXP0_218 (io), F42 MGTHTXN0_218 (io), G39 MGTHRXP3_217 (io), G40 MGTHRXN3_217 (io), G43 MGTHTXP3_217 (io), G44 MGTHTXN3_217 (io), H41 MGTHRXP2_217 (io), H42 MGTHRXN2_217 (io), J39 MGTHRXP1_217 (io), J40 MGTHRXN1_217 (io), J43 MGTHTXP2_217 (io), J44 MGTHTXN2_217 (io), K37 MGTREFCLK0P_217 (io), K38 MGTREFCLK0N_217 (io), K41 MGTHTXP1_217 (io), K42 MGTHTXN1_217 (io), L39 MGTHRXP0_217 (io), L40 MGTHRXN0_217 (io), L43 MGTHTXP0_217 (io), L44 MGTHTXN0_217 (io), M37 MGTREFCLK1P_217 (io), M38 MGTREFCLK1N_217 (io)